# Altium footprint library XU-GENARAL PCB .PcbLib: 1176 footprints (part 5 of 75)
Each footprint in its own frame and in the unit in brackets; x right, y up, seen from the top. Pads: shape width x height; smd on the part's side, far side on the other; paste and mask are expansions set on the pad; w line width, h text height; cw(c..) or ccw(c..) is an arc to the next point about the centre after c.
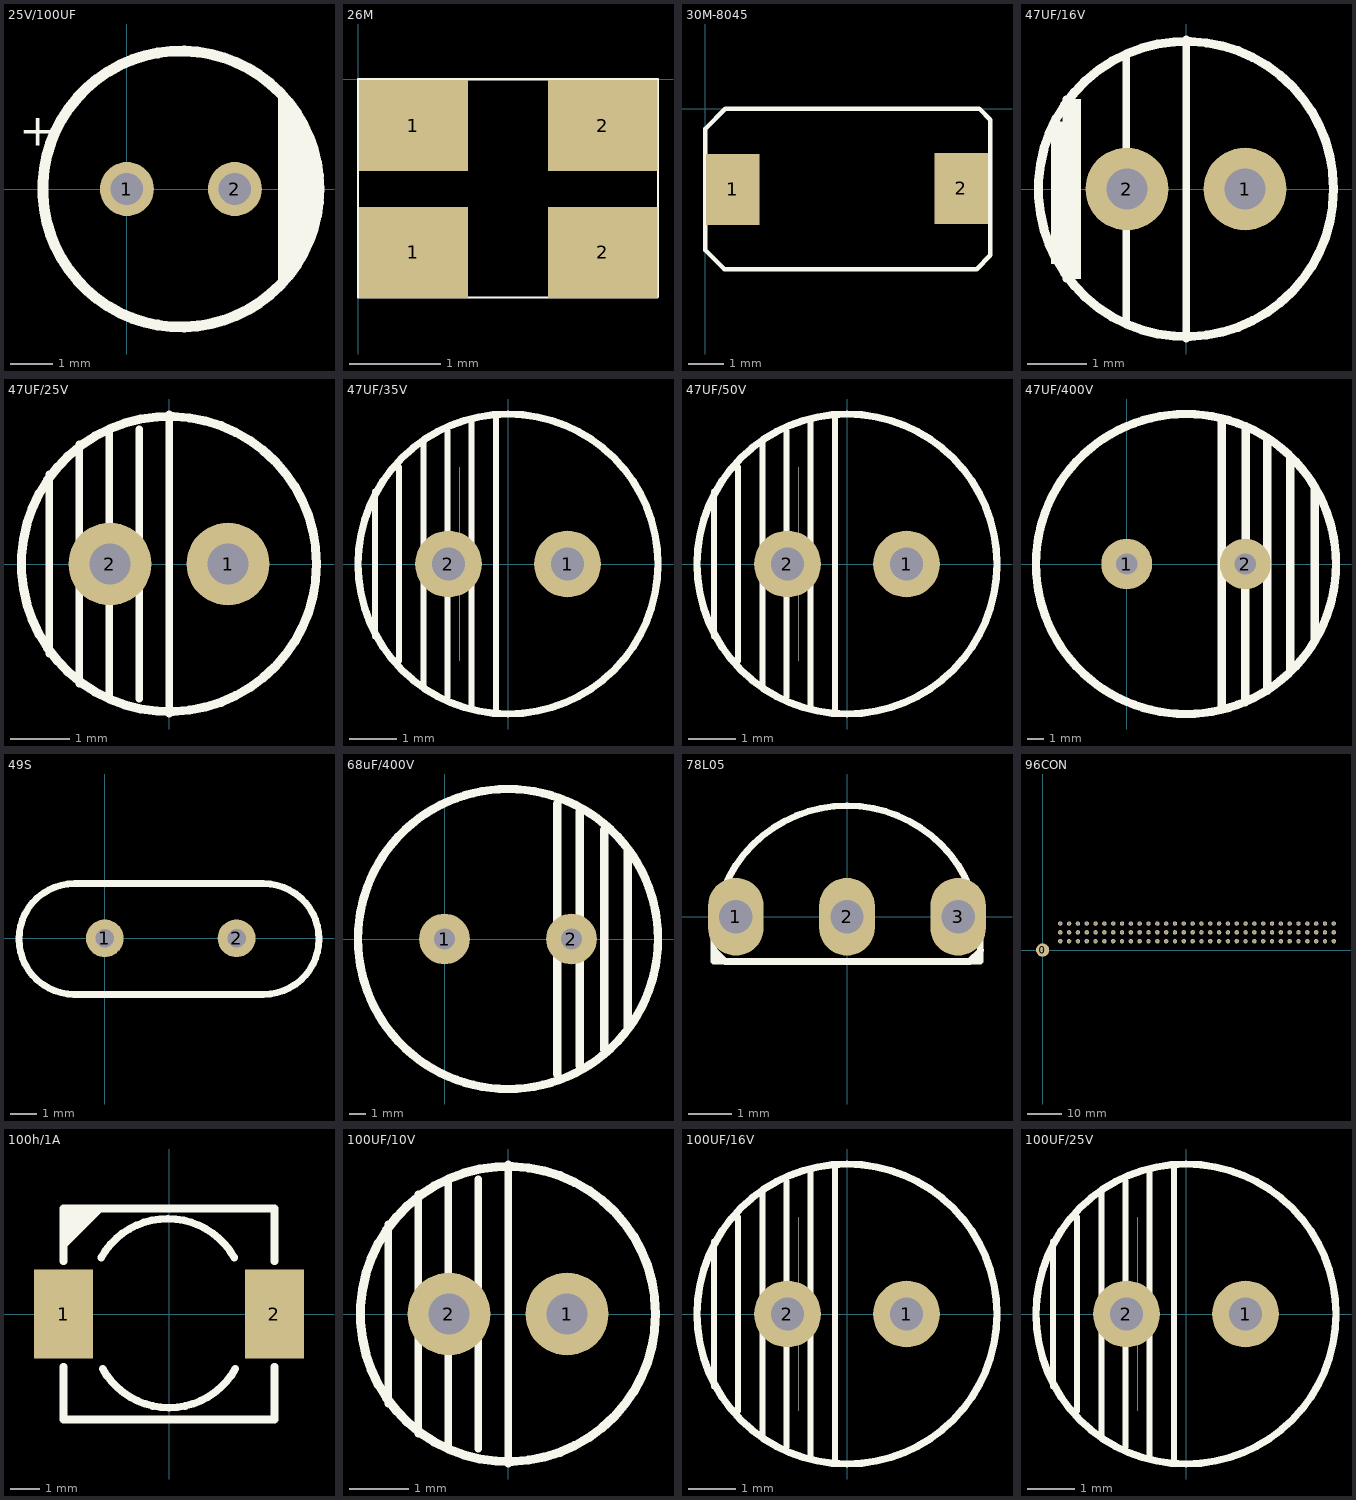
[diagram p4: the footprints below, top view; thin cyan lines are the x and y axes]

## 25V/100UF [mil]
height 43.31
pads (2):
  round 50 hole 30: 1(0,0) 2(100,0)
Top Overlay:
  circle w10: c50,0 r127.95
  region: 155,80 140,80 140,-80 155,-80
  region: 165,65 155,65 155,-65 165,-65
  region: 175,45 165,45 165,-45 175,-45
  lines w10: 145,-85 145,-70 ; 145,75 145,85
  text "+" at -100,40 h30

## 26M [mm]
pads (4):
  rect 1.2x1 smd: 1(0.61,-1.905) 1(0.61,-0.508) 2(2.692,-1.905) 2(2.692,-0.508)
Top Overlay:
  lines w0.025: 0,-2.4 0,0 3.3,0 3.3,-2.386 3.3,-2.39 3.29,-2.4 0,-2.4

## 30M-8045 [mil]
pads (2):
  rect 59.06x78.74 smd: 1(30,-89) 2(283,-88)
Top Overlay:
  lines w5: 0,-156.17 0,-22 22,0 303,0 314.96,-11.96 314.96,-162 299.8,-177.17 21,-177.17 0,-156.17

## 47UF/16V [mm]
pads (2):
  round 1.4 hole 0.7: 1(1,0) 2(-1,0)
Top Overlay:
  circle w0.152: c0,0 r2.5
  rectangle: -1.016,-2.032 -1.016,2.032
  rectangle: -2.286,-1.27 -2.032,1.143
  rectangle: -2.032,-1.524 -1.778,1.524
  lines w0.127: -2.032,-1.524 -2.032,1.524 ; -1.016,-2.286 -1.016,-2.032 -1.016,2.032 -1.016,2.286 ; 0,-2.54 0,2.54

## 47UF/25V [mm]
pads (2):
  round 1.4 hole 0.7: 1(1,0) 2(-1,0)
Top Overlay:
  circle w0.152: c0,0 r2.5
  rectangle: -1.016,-2.032 -1.016,2.032
  lines w0.127: -2.032,-1.524 -2.032,1.524 ; -1.524,-2.032 -1.524,2.032 ; -1.016,-2.286 -1.016,-2.032 -1.016,2.032 -1.016,2.286 ; -0.508,-2.286 -0.508,-2.032 -0.508,2.032 -0.508,2.286 ; 0,-2.54 0,2.54

## 47UF/35V [mm]
pads (2):
  round 1.4 hole 0.7: 1(1.25,0) 2(-1.25,0)
Top Overlay:
  circle w0.152: c0,0 r3.15
  rectangle: -1.016,-2.032 -1.016,2.032
  lines w0.127: -2.794,-1.524 -2.794,1.524 ; -2.286,-2.032 -2.286,2.032 ; -1.778,-2.54 -1.778,2.54 ; -1.27,-2.794 -1.27,2.794 ; -0.762,-3.048 -0.762,3.048 ; -0.254,-3.048 -0.254,3.048

## 47UF/50V [mm]
pads (2):
  round 1.4 hole 0.7: 1(1.25,0) 2(-1.25,0)
Top Overlay:
  circle w0.152: c0,0 r3.15
  rectangle: -1.016,-2.032 -1.016,2.032
  lines w0.127: -2.794,-1.524 -2.794,1.524 ; -2.286,-2.032 -2.286,2.032 ; -1.778,-2.54 -1.778,2.54 ; -1.27,-2.794 -1.27,2.794 ; -0.762,-3.048 -0.762,3.048 ; -0.254,-3.048 -0.254,3.048

## 47UF/400V [mil]
pads (2):
  round 120 hole 50: 1(0,0) 2(280,0)
Top Overlay:
  circle w20: c140,0 r354.33
  lines w20: 224,-342 224,339 ; 280,-327 280,-45 ; 281,54 281,325 ; 332,-300 332,294 ; 386,-252 386,253 ; 444,-177 444,178

## 49S [mm]
pads (2):
  round 1.42 hole 0.7: 1(0,0) 2(4.953,0)
Top Overlay:
  lines w0.254: -1.168,-2.108 5.944,-2.108 ; -1.143,-2.11 cw(c-1.143,-0.027) -1.143,2.056 ; -1.143,2.057 5.969,2.057 ; 5.969,-2.109 ccw(c5.969,-0.027) 5.969,2.055

## 68uF/400V [mil]
pads (2):
  round 120 hole 50: 1(0,0) 2(300,0)
Top Overlay:
  circle w20: c150,0 r354.33
  lines w20: 266,-320 266,320 ; 320,-299 320,301 ; 377,-262 377,258 ; 433,-211 433,209

## 78L05 [mil]
pads (3):
  oval 50x70 hole 30: 1(-100,0) 2(0,0) 3(100,0)
Top Overlay:
  lines w6: -119.61,-30.18 -109.61,-40.18 110.39,-40.18 120.39,-30.18 ; -100,-40 -120,-40 -120,-20 cw(c0,-20) 120,-20 120,-40 100,-40

## 96CON [mil]
pads (97):
  round 150 hole 30: 0(0,0)
  round 50 hole 30: 1(3300,300) 2(3200,300) 3(3100,300) 4(3000,300) 5(2900,300) 6(2800,300) 7(2700,300) 8(2600,300) 9(2500,300) 10(2400,300) 11(2300,300) 12(2200,300) 13(2100,300) 14(2000,300) 15(1900,300) 16(1800,300) 17(1700,300) 18(1600,300) 19(1500,300) 20(1400,300) 21(1300,300) 22(1200,300) 23(1100,300) 24(1000,300) 25(900,300) 26(800,300) 27(700,300) 28(600,300) 29(500,300) 30(400,300) 31(300,300) 32(200,300) 33(3300,200) 34(3200,200) 35(3100,200) 36(3000,200) 37(2900,200) 38(2800,200) 39(2700,200) 40(2600,200) 41(2500,200) 42(2400,200) 43(2300,200) 44(2200,200) 45(2100,200) 46(2000,200) 47(1900,200) 48(1800,200) 49(1700,200) 50(1600,200) 51(1500,200) 52(1400,200) 53(1300,200) 54(1200,200) 55(1100,200) 56(1000,200) 57(900,200) 58(800,200) 59(700,200) 60(600,200) 61(500,200) 62(400,200) 63(300,200) 64(200,200) 65(3300,100) 66(3200,100) 67(3100,100) 68(3000,100) 69(2900,100) 70(2800,100) 71(2700,100) 72(2600,100) 73(2500,100) 74(2400,100) 75(2300,100) 76(2200,100) 77(2100,100) 78(2000,100) 79(1900,100) 80(1800,100) 81(1700,100) 82(1600,100) 83(1500,100) 84(1400,100) 85(1300,100) 86(1200,100) 87(1100,100) 88(1000,100) 89(900,100) 90(800,100) 91(700,100) 92(600,100) 93(500,100) 94(400,100) 95(300,100) 96(200,100)

## 100h/1A [mm]
height 1.1
pads (2):
  rect 2x3 smd: 1(-3.556,0) 2(3.556,0)
Top Overlay:
  region: -3.556,2.159 -2.159,3.556 -3.556,3.556
  lines w0.254: -3.556,-1.778 -3.556,-3.556 3.556,-3.556 3.556,-1.778 ; -3.556,1.778 -3.556,3.556 3.556,3.556 3.556,3.302 3.556,1.778 ; -2.286,1.905 cw(c-0.046,0.645) 2.194,1.905 ; -2.24,-1.848 ccw(c0,-0.588) 2.24,-1.848

## 100UF/10V [mm]
pads (2):
  round 1.4 hole 0.7: 1(1,0) 2(-1,0)
Top Overlay:
  circle w0.152: c0,0 r2.5
  rectangle: -1.016,-2.032 -1.016,2.032
  lines w0.127: -2.032,-1.524 -2.032,1.524 ; -1.524,-2.032 -1.524,2.032 ; -1.016,-2.286 -1.016,-2.032 -1.016,2.032 -1.016,2.286 ; -0.508,-2.286 -0.508,-2.032 -0.508,2.032 -0.508,2.286 ; 0,-2.54 0,2.54

## 100UF/16V [mm]
pads (2):
  round 1.4 hole 0.7: 1(1.25,0) 2(-1.25,0)
Top Overlay:
  circle w0.152: c0,0 r3.15
  rectangle: -1.016,-2.032 -1.016,2.032
  lines w0.127: -2.794,-1.524 -2.794,1.524 ; -2.286,-2.032 -2.286,2.032 ; -1.778,-2.54 -1.778,2.54 ; -1.27,-2.794 -1.27,2.794 ; -0.762,-3.048 -0.762,3.048 ; -0.254,-3.048 -0.254,3.048

## 100UF/25V [mm]
pads (2):
  round 1.4 hole 0.7: 1(1.25,0) 2(-1.25,0)
Top Overlay:
  circle w0.152: c0,0 r3.15
  rectangle: -1.016,-2.032 -1.016,2.032
  lines w0.127: -2.794,-1.524 -2.794,1.524 ; -2.286,-2.032 -2.286,2.032 ; -1.778,-2.54 -1.778,2.54 ; -1.27,-2.794 -1.27,2.794 ; -0.762,-3.048 -0.762,3.048 ; -0.254,-3.048 -0.254,3.048